# Altium footprint library 常用元件封装库.PcbLib: 1310 footprints (part 8 of 83)
Each footprint in its own frame and in the unit in brackets; x right, y up, seen from the top. Pads: shape width x height; smd on the part's side, far side on the other; paste and mask are expansions set on the pad; w line width, h text height; cw(c..) or ccw(c..) is an arc to the next point about the centre after c.
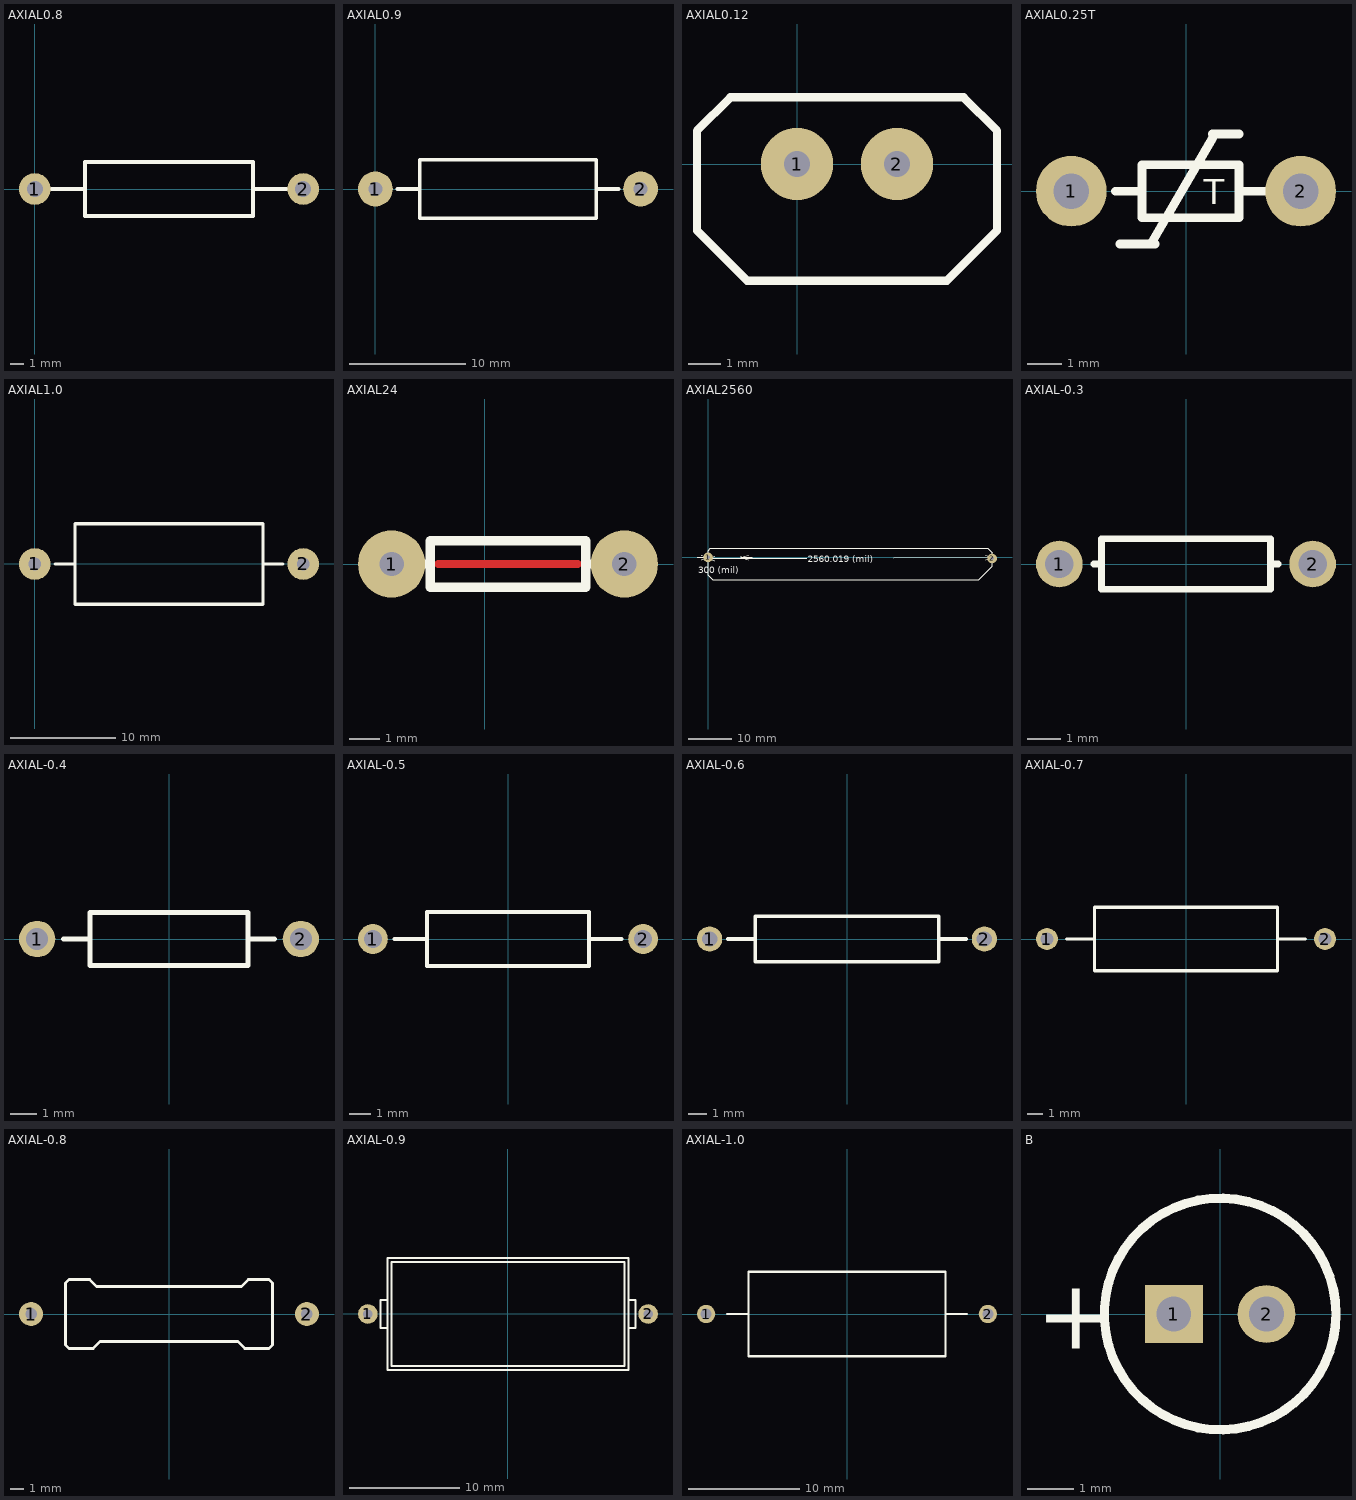
[diagram p7: the footprints below, top view; thin cyan lines are the x and y axes]

## AXIAL0.8 [mm]
pads (2):
  round 2.4 hole 1.2: 1(0,0) 2(20.32,0)
Top Overlay:
  lines w0.305: 1.27,0 3.81,0 ; 16.51,0 19.05,0 ; 3.81,-2.032 16.51,-2.032 16.51,2.032 3.81,2.032 3.81,-2.032

## AXIAL0.9 [mm]
pads (2):
  round 3 hole 1.2: 1(0,0) 2(22.86,0)
Top Overlay:
  lines w0.305: 1.905,0 3.81,0 ; 19.05,0 20.955,0 ; 3.81,-2.54 3.81,2.54 19.05,2.54 19.05,-2.54 3.81,-2.54

## AXIAL0.12 [mm]
pads (2):
  round 2.2 hole 0.8: 1(0,0) 2(3.048,0)
Top Overlay:
  lines w0.254: -3.048,-2.032 -1.524,-3.556 4.572,-3.556 6.096,-2.032 6.096,1.016 5.08,2.032 -2.032,2.032 -3.048,1.016 -3.048,-2.032

## AXIAL0.25T [mil]
pads (2):
  round 80 hole 40: 1(-130,0) 2(130,0)
Top Overlay:
  lines w10: -80,0 -50,0 ; -75,-60 -35,-60 ; -40,-60 30,60 ; 30,65 60,65 ; 60,0 90,0 ; -50,-30 60,-30 60,30 -50,30 -50,-30
  text "T" at 20,-15 h28

## AXIAL1.0 [mm]
pads (2):
  round 3 hole 1.2: 1(0,0) 2(25.4,0)
Top Overlay:
  lines w0.305: 1.905,0 3.81,0 ; 21.59,0 23.495,0 ; 3.81,-3.81 21.59,-3.81 21.59,3.81 3.81,3.81 3.81,-3.81

## AXIAL24 [mm]
pads (2):
  round 2.2 hole 0.8: 1(-3.048,0) 2(4.572,0)
Top Layer:
  lines w0.254: -1.524,0 3.048,0
Top Overlay:
  lines w0.305: -2.007,0 -1.778,0 ; 3.531,0 3.302,0 ; 3.302,0 3.302,-0.762 -1.778,-0.762 -1.778,0.762 3.302,0.762 3.302,0

## AXIAL2560 [mm]
pads (2):
  round 2.2 hole 0.8: 1(0,0) 2(65.025,-0.254)
Top Overlay:
  lines w0.254: -2.54,0 0,0 ; -1.524,-0.508 0,0 ; -1.524,0.508 0,0 ; -0.001,0 0.001,-0.508 ; 0,0.254 0,-0.254 ; 1.522,0.26 0,-0.254 ; 1.526,-0.756 0,-0.254 ; 7.62,-0.254 7.62,0.254 ; 9.144,-0.508 7.62,0 ; 9.144,0.508 7.62,0 ; 10.16,0 7.62,0 ; 22.584,-0.166 0,-0.254 ; 42.44,-0.088 65.024,0 ; 63.498,0.502 65.024,0 ; 63.502,-0.514 65.024,0 ; 65.023,0.254 65.025,-0.254 ; 0,0 0,-4.064 1.016,-5.08 61.976,-5.08 65.025,-2.031 65.025,-0.254 ; 0,0 0,1.524 0.508,2.032 64.008,2.032 65.025,1.015 65.025,-0.254
  text "2560.019 (mil)" at 22.841,-1.079 h1.52
  text "300 (mil)" at -2.309,-3.657 h1.52

## AXIAL-0.3 [mm] "Resistor; 2 Leads"
height 1.524
pads (2):
  round 1.4 hole 0.85: 1(-3.81,0) 2(3.81,0)
Top Overlay:
  lines w0.2: -2.769,0 -2.54,0 ; 2.769,0 2.54,0 ; 2.54,0 2.54,0.762 -2.54,0.762 -2.54,-0.762 2.54,-0.762 2.54,0

## AXIAL-0.4 [mm] "Resistor; 2 Leads"
height 2.032
pads (2):
  round 1.4 hole 0.85: 1(-5.08,0) 2(5.08,0)
Top Overlay:
  lines w0.2: -4.064,0 -3.048,0 ; 3.048,0 4.064,0 ; -3.048,-1.016 -3.048,1.016 3.048,1.016 3.048,-1.016 -3.048,-1.016

## AXIAL-0.5 [mm] "Semiconductor Resistor; 2 Leads"
height 2.54
pads (2):
  round 1.4 hole 0.85: 1(-6.35,0) 2(6.35,0)
Top Overlay:
  lines w0.2: -5.334,0 -3.81,0 ; 3.81,0 5.334,0 ; -3.81,-1.27 -3.81,1.27 3.81,1.27 3.81,-1.27 -3.81,-1.27

## AXIAL-0.6 [mm] "Variable Resistor; 2 Leads"
height 2.54
pads (2):
  round 1.4 hole 0.85: 1(-7.62,0) 2(7.62,0)
Top Overlay:
  lines w0.2: -6.604,0 -5.08,0 ; 5.08,0 6.604,0 ; -5.08,-1.27 -5.08,1.27 5.08,1.27 5.08,-1.27 -5.08,-1.27

## AXIAL-0.7 [mm] "Variable Resistor; 2 Leads"
height 4.064
pads (2):
  round 1.4 hole 0.85: 1(-8.89,0) 2(8.89,0)
Top Overlay:
  lines w0.2: -7.62,0 -5.842,0 ; 5.842,0 7.62,0 ; -5.842,-2.032 5.842,-2.032 5.842,2.032 -5.842,2.032 -5.842,-2.032

## AXIAL-0.8 [mil] "插件电阻"
height 100
pads (2):
  round 70 hole 33.46: 1(-400,0) 2(400,0)
Top Overlay:
  lines w7.87: -300,-90 -290,-100 -220,-100 -200,-80 200,-80 220,-100 290,-100 300,-90 300,90 290,100 230,100 210,80 -210,80 -230,100 -290,100 -300,90 -300,-90
3D body: height 98.43, standoff 0, extent -407.81,-7.85 -392.12,7.86
3D body: height 98.43, standoff 0, extent 392.2,-7.85 407.88,7.87
3D body: height 106.24, standoff 90.55, extent 295,-6.44 405.24,9.27
3D body: height 106.24, standoff 90.55, extent -405.24,-6.44 -295,9.27
3D body: height 176.54, standoff 19.68, extent -216.53,-77.17 216.54,80
3D body: height 196.07, standoff 0, extent 216.26,-96.82 295,99.64
3D body: height 196.07, standoff 0, extent -295,-96.82 -216.26,99.64

## AXIAL-0.9 [mil] "插件电阻"
height 100
pads (2):
  round 70 hole 33.46: 1(-500,0) 2(500,0)
Top Overlay:
  lines w7.87: -430,-50 -455,-50 -455,50 -430,50 ; 430,-50 455,-50 455,50 430,50 ; -430,-200 430,-200 430,200 -430,200 -430,-200 ; -415,-185 415,-185 415,185 -415,185 -415,-185

## AXIAL-1.0 [mm] "Adjustable Magnetic-Core Inductor; 2 Leads"
height 7.62
pads (2):
  round 1.65 hole 1: 1(-12.7,0) 2(12.7,0)
Top Overlay:
  lines w0.2: -10.795,0 -8.89,0 ; 8.89,0 10.795,0 ; -8.89,-3.81 8.89,-3.81 8.89,3.81 -8.89,3.81 -8.89,-3.81

## B [mm] "Capacitor, Electrolytic, Radial; Body 5 x 6.8 mm (Dia.xH typ); Pin Spacing 2 mm (typ)"
pads (2):
  rect 1.25x1.25 hole 0.75: 1(-1,0)
  round 1.25 hole 0.75: 2(1,0)
Top Overlay:
  circle w0.2: c0,0 r2.5
  text "+" at -3.975,-0.75 h1.5